# Altium footprint library Austindetz_CM4_Board_v1.0.PcbLib: 102 footprints (part 4 of 7)
Each footprint in its own frame and in the unit in brackets; x right, y up, seen from the top. Pads: shape width x height; smd on the part's side, far side on the other; paste and mask are expansions set on the pad; w line width, h text height; cw(c..) or ccw(c..) is an arc to the next point about the centre after c.
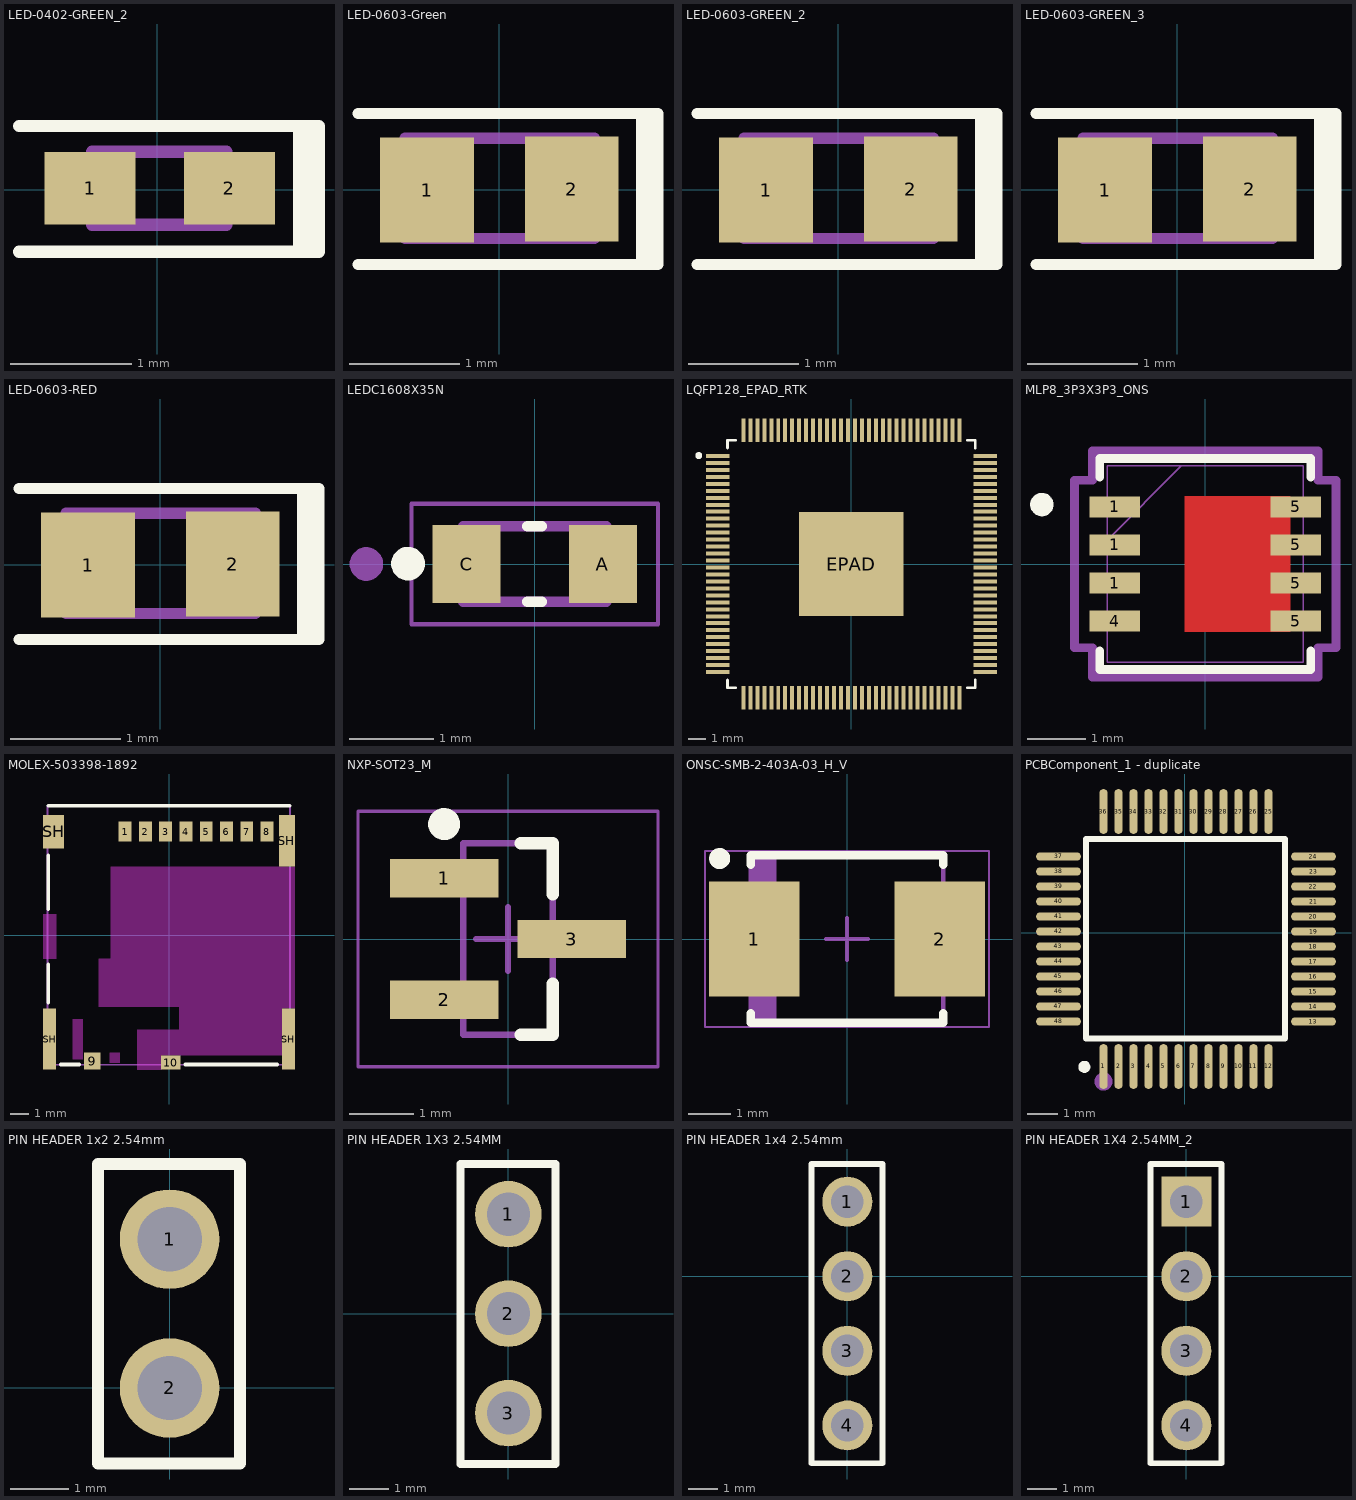
[diagram p3: the footprints below, top view; thin cyan lines are the x and y axes]

## LED-0402-GREEN_2 [mm]
pads (2):
  rect 0.75x0.6 smd: 1(-0.556,0.014) 2(0.594,0.014)
Top Overlay:
  lines w0.1: -1.142,-0.51 1.259,-0.51 1.259,0.526 ; -1.142,0.526 1.259,0.526 ; 1.169,0.516 1.169,-0.511 1.332,-0.51 1.332,0.526 1.259,0.526
Top Assembly:
  lines w0.1: -0.539,-0.287 0.568,-0.287 0.568,0.315 -0.539,0.315 -0.539,-0.287
  text "'.Designator'" at -2.951,-1.606 h1.27
3D body "ChipLedWith-Green.stp": height 0.16, standoff 0, extent -0.502,-0.252 0.502,0.252

## LED-0603-Green [mm] "Chip Resistor, 2-Leads, Body 1.60x0.80mm, IPC Medium Density"
height 0.45
pads (2):
  rect 0.85x0.95 smd: 1(-0.655,-0.005) 2(0.655,0.005)
Top Overlay:
  lines w0.1: -1.281,-0.68 1.288,-0.68 ; -1.281,0.691 1.288,0.691 ; 1.319,0.691 1.436,0.691 1.436,-0.68 1.288,-0.68 ; 1.35,-0.68 1.35,0.691 1.288,0.691 ; 1.288,-0.68 1.288,0.691
Top Assembly:
  lines w0.1: -0.856,-0.441 0.862,-0.441 0.862,0.465 -0.797,0.465 -0.856,0.465 -0.856,-0.441
  text "'.Designator'" at -2.79,-1.783 h1.27
3D body "LED Green SMD 0603 Würth 150060BS55040.stp": height 0.4, standoff 0, extent -0.8,-0.4 0.8,0.4

## LED-0603-GREEN_2 [mm]
pads (2):
  rect 0.85x0.95 smd: 1(-0.655,-0.005) 2(0.655,0.005)
Top Overlay:
  lines w0.1: -1.281,-0.68 1.288,-0.68 ; -1.281,0.691 1.288,0.691 ; 1.319,0.691 1.436,0.691 1.436,-0.68 1.288,-0.68 ; 1.35,-0.68 1.35,0.691 1.288,0.691 ; 1.288,-0.68 1.288,0.691
Top Assembly:
  lines w0.1: -0.856,-0.441 -0.856,0.465 -0.797,0.465 0.862,0.465 0.862,-0.441 -0.856,-0.441
  text "'.Designator'" at -2.79,-1.783 h1.27
3D body "LED Green SMD 0603 Würth 150060BS55040.stp": height 0.4, standoff 0, extent -0.8,-0.4 0.8,0.4

## LED-0603-GREEN_3 [mm]
pads (2):
  rect 0.85x0.95 smd: 1(-0.655,-0.005) 2(0.655,0.005)
Top Overlay:
  lines w0.1: -1.281,-0.68 1.288,-0.68 ; -1.281,0.691 1.288,0.691 ; 1.319,0.691 1.436,0.691 1.436,-0.68 1.288,-0.68 ; 1.35,-0.68 1.35,0.691 1.288,0.691 ; 1.288,-0.68 1.288,0.691
Top Assembly:
  lines w0.1: -0.856,-0.441 -0.856,0.465 -0.797,0.465 0.862,0.465 0.862,-0.441 -0.856,-0.441
  text "'.Designator'" at -2.79,-1.783 h1.27
3D body "LED Green SMD 0603 Würth 150060BS55040.stp": height 0.4, standoff 0, extent -0.8,-0.4 0.8,0.4

## LED-0603-RED [mm] "Chip Resistor, 2-Leads, Body 1.60x0.80mm, IPC Medium Density"
height 0.45
pads (2):
  rect 0.85x0.95 smd: 1(-0.655,-0.005) 2(0.655,0.005)
Top Overlay:
  lines w0.1: -1.281,-0.68 1.288,-0.68 ; -1.281,0.691 1.288,0.691 ; 1.319,0.691 1.436,0.691 1.436,-0.68 1.288,-0.68 ; 1.35,-0.68 1.35,0.691 1.288,0.691 ; 1.288,-0.68 1.288,0.691
Top Assembly:
  lines w0.1: -0.856,-0.441 0.862,-0.441 0.862,0.465 -0.797,0.465 -0.856,0.465 -0.856,-0.441
  text "'.Designator'" at -3.196,-1.747 h1.27
3D body "LED Red SMD 0603 Würth 150060SS55040.stp": height 0.4, standoff 0, extent -0.8,-0.4 0.8,0.4

## LEDC1608X35N [mm]
height 13.32
pads (2):
  rect 0.81x0.93 smd: A(0.81,0) C(-0.81,0)
Top Overlay:
  circle w0.2: c-1.505,0.004 r0.1
  lines w0.127: -0.085,-0.45 0.085,-0.45 ; -0.085,0.45 0.085,0.45
Mechanical 13:
  circle w0.2: c-2,0 r0.1
  lines w0.127: -0.85,-0.45 0.85,-0.45 0.85,0.45 -0.85,0.45 -0.85,-0.45
Mechanical 15:
  lines w0.05: -1.465,-0.715 1.465,-0.715 1.465,0.715 -1.465,0.715 -1.465,-0.715

## LQFP128_EPAD_RTK [mil]
height 130.31
pads (129):
  rect 53.5x9 smd: 1(-302.25,244.09) 2(-302.25,228.35) 3(-302.25,212.6) 4(-302.25,196.85) 5(-302.25,181.1) 6(-302.25,165.35) 7(-302.25,149.61) 8(-302.25,133.86) 9(-302.25,118.11) 10(-302.25,102.36) 11(-302.25,86.61) 12(-302.25,70.87) 13(-302.25,55.12) 14(-302.25,39.37) 15(-302.25,23.62) 16(-302.25,7.87) 17(-302.25,-7.87) 18(-302.25,-23.62) 19(-302.25,-39.37) 20(-302.25,-55.12) 21(-302.25,-70.87) 22(-302.25,-86.61) 23(-302.25,-102.36) 24(-302.25,-118.11) 25(-302.25,-133.86) 26(-302.25,-149.61) 27(-302.25,-165.35) 28(-302.25,-181.1) 29(-302.25,-196.85) 30(-302.25,-212.6) 31(-302.25,-228.35) 32(-302.25,-244.09) 65(302.25,-244.09) 66(302.25,-228.35) 67(302.25,-212.6) 68(302.25,-196.85) 69(302.25,-181.1) 70(302.25,-165.35) 71(302.25,-149.61) 72(302.25,-133.86) 73(302.25,-118.11) 74(302.25,-102.36) 75(302.25,-86.61) 76(302.25,-70.87) 77(302.25,-55.12) 78(302.25,-39.37) 79(302.25,-23.62) 80(302.25,-7.87) 81(302.25,7.87) 82(302.25,23.62) 83(302.25,39.37) 84(302.25,55.12) 85(302.25,70.87) 86(302.25,86.61) 87(302.25,102.36) 88(302.25,118.11) 89(302.25,133.86) 90(302.25,149.61) 91(302.25,165.35) 92(302.25,181.1) 93(302.25,196.85) 94(302.25,212.6) 95(302.25,228.35) 96(302.25,244.09)
  rect 9x53.5 smd: 33(-244.09,-302.25) 34(-228.35,-302.25) 35(-212.6,-302.25) 36(-196.85,-302.25) 37(-181.1,-302.25) 38(-165.35,-302.25) 39(-149.61,-302.25) 40(-133.86,-302.25) 41(-118.11,-302.25) 42(-102.36,-302.25) 43(-86.61,-302.25) 44(-70.87,-302.25) 45(-55.12,-302.25) 46(-39.37,-302.25) 47(-23.62,-302.25) 48(-7.87,-302.25) 49(7.87,-302.25) 50(23.62,-302.25) 51(39.37,-302.25) 52(55.12,-302.25) 53(70.87,-302.25) 54(86.61,-302.25) 55(102.36,-302.25) 56(118.11,-302.25) 57(133.86,-302.25) 58(149.61,-302.25) 59(165.35,-302.25) 60(181.1,-302.25) 61(196.85,-302.25) 62(212.6,-302.25) 63(228.35,-302.25) 64(244.09,-302.25) 97(244.09,302.25) 98(228.35,302.25) 99(212.6,302.25) 100(196.85,302.25) 101(181.1,302.25) 102(165.35,302.25) 103(149.61,302.25) 104(133.86,302.25) 105(118.11,302.25) 106(102.36,302.25) 107(86.61,302.25) 108(70.87,302.25) 109(55.12,302.25) 110(39.37,302.25) 111(23.62,302.25) 112(7.87,302.25) 113(-7.87,302.25) 114(-23.62,302.25) 115(-39.37,302.25) 116(-55.12,302.25) 117(-70.87,302.25) 118(-86.61,302.25) 119(-102.36,302.25) 120(-118.11,302.25) 121(-133.86,302.25) 122(-149.61,302.25) 123(-165.35,302.25) 124(-181.1,302.25) 125(-196.85,302.25) 126(-212.6,302.25) 127(-228.35,302.25) 128(-244.09,302.25)
  rect 236x236 smd paste+0: EPAD(0,0)
Top Overlay:
  circle w7.87: c-345,245 r3.94
  lines w6: -280,-262 -280,-280 -262,-280 ; -280,262 -280,280 -262,280 ; 262,-280 280,-280 280,-262 ; 262,280 280,280 280,262
Top Paste:
  region: -114.06,114.06 -114.06,62.94 -62.94,62.94 -62.94,114.06
  region: -114.06,55.06 -114.06,3.94 -62.94,3.94 -62.94,55.06
  region: -114.06,-3.94 -114.06,-55.06 -62.94,-55.06 -62.94,-3.94
  region: -114.06,-62.94 -114.06,-114.06 -62.94,-114.06 -62.94,-62.94
  region: -55.06,114.06 -55.06,62.94 -3.94,62.94 -3.94,114.06
  region: -55.06,55.06 -55.06,3.94 -3.94,3.94 -3.94,55.06
  region: -55.06,-3.94 -55.06,-55.06 -3.94,-55.06 -3.94,-3.94
  region: -55.06,-62.94 -55.06,-114.06 -3.94,-114.06 -3.94,-62.94
  region: 3.94,114.06 3.94,62.94 55.06,62.94 55.06,114.06
  region: 3.94,55.06 3.94,3.94 55.06,3.94 55.06,55.06
  region: 3.94,-3.94 3.94,-55.06 55.06,-55.06 55.06,-3.94
  region: 3.94,-62.94 3.94,-114.06 55.06,-114.06 55.06,-62.94
  region: 62.94,114.06 62.94,62.94 114.06,62.94 114.06,114.06
  region: 62.94,55.06 62.94,3.94 114.06,3.94 114.06,55.06
  region: 62.94,-3.94 62.94,-55.06 114.06,-55.06 114.06,-3.94
  region: 62.94,-62.94 62.94,-114.06 114.06,-114.06 114.06,-62.94
Mechanical 18:
  lines w6: 302,244 315,244
3D body: height 39.37, standoff 0, extent -280,-280.83 280,280

## MLP8_3P3X3P3_ONS [mil]
height 130.31
pads (8):
  rect 34x14 smd paste+0 mask+0: 1(-61,-12.8) 1(-61,12.8) 1(-61,38.39) 4(-61,-38.39) 5(61,-38.39) 5(61,-12.8) 5(61,12.8) 5(61,38.39)
Top Layer:
  region: -13.85,-45.5 -13.85,45.5 57.15,45.5 57.15,-45.5
Top Overlay:
  circle w7.87: c-110,40 r3.94
  lines w6: -71,-58.49 -71,-71 71,-71 71,-58.49 ; -71,58.49 -71,71 71,71 71,58.49
Top Paste:
  region: -13.85,-45.5 -13.85,45.5 57.15,45.5 57.15,-45.5
Top Solder:
  region: -13.85,-45.5 -13.85,45.5 57.15,45.5 57.15,-45.5
Mechanical 13:
  lines w1: -66,16 -16,66 ; -66,-66 -66,66 66,66 66,-66 -66,-66 ; -66,-46.39 -66,-30.39 -66,-46.39 ; -66,-20.8 -66,-4.8 -66,-20.8 ; -66,4.8 -66,20.8 -66,4.8 ; -66,30.39 -66,46.39 -66,30.39 ; 66,-46.39 66,-30.39 66,-46.39 ; 66,-20.8 66,-4.8 66,-20.8 ; 66,4.8 66,20.8 66,4.8 ; 66,30.39 66,46.39 66,30.39
  text "*" at -31.5,13.39 h50
Mechanical 15:
  lines w6: -88,-56.39 -88,56.39 -76,56.39 -76,76 -5.2,76 5.2,76 76,76 76,56.39 88,56.39 88,-56.39 76,-56.39 76,-76 5.2,-76 -5.2,-76 -76,-76 -76,-56.39 -88,-56.39
3D body "MLP8_3P3X3P3_ONS.step": height 32.09, standoff 0, extent -65.98,-65.98 65.98,65.98

## MOLEX-503398-1892 [mm]
pads (14):
  rect 0.7x1.1 smd: 1(-2.38,5.625) 2(-1.28,5.625) 3(-0.18,5.625) 4(0.92,5.625) 5(2.02,5.625) 6(3.12,5.625) 7(4.22,5.625) 8(5.32,5.625)
  rect 0.9x0.93 smd: 9(-4.17,-6.84)
  rect 1.05x0.78 smd: 10(0.095,-6.915)
  rect 0.7x3.33 smd: SH(-6.48,-5.64) SH(6.48,-5.64)
  rect 1.14x1.83 smd: SH(-6.26,5.61)
  rect 0.86x2.8 smd: SH(6.4,5.125)
Top Overlay:
  lines w0.2: -6.55,-3.675 -6.55,-1.575 ; -6.55,1.425 -6.55,4.325 ; -6.55,7.025 6.55,7.025 ; -5.876,-7.025 -4.874,-7.025 ; 0.874,-7.025 5.876,-7.025
Keep-Out Layer:
  region: -6.13,-1.276 -6.836,-1.276 -6.836,1.125 -6.13,1.125
  region: -2.67,-6.93 -3.223,-6.93 -3.223,-6.375 -2.67,-6.375
  region: -4.685,-6.73 -5.239,-6.73 -5.239,-4.575 -4.685,-4.575
  region: -2.67,-6.937 -3.225,-6.937 -3.225,-6.375 -2.67,-6.375
  region: 6.827,-3.975 6.127,-3.975 6.127,-6.526 -0.43,-6.526 -0.43,-7.305 -1.73,-7.305 -1.73,-5.125 0.57,-5.125 0.57,-3.875 -3.82,-3.875 -3.82,-1.275 -3.17,-1.275 -3.17,3.725 6.827,3.725
Top Assembly:
  lines w0.1: -6.599,-7.04 -6.599,7.007 6.563,7.007 6.563,-7.04 -6.599,-7.04
  text "'.Designator'" at -5.403,-0.523 h2
3D body "5033981892--3DModel-STEP-56544.STEP": height 1.4, standoff 0, extent -6.55,-7.025 6.55,7.045

## NXP-SOT23_M [mm] "SOT23, 3-Leads, Body 3x1.4mm, Pitch 0.95mm, IPC Low Density"
height 1.1
pads (3):
  rect 1.7x0.6 smd: 1(-1,0.95) 2(-1,-0.95) 3(1,0)
Top Overlay:
  circle w0.25: c-1,1.8 r0.125
  lines w0.2: 0.2,-1.5 0.7,-1.5 0.7,-0.7 ; 0.2,1.5 0.7,1.5 0.7,0.7
Mechanical 13:
  lines w0.1: -0.7,-1.5 -0.7,1.5 0.7,1.5 0.7,-1.5 -0.7,-1.5
Mechanical 15:
  lines w0.05: -2.35,-2 -2.35,2 2.35,2 2.35,-2 -2.35,-2
  lines w0.1: -0.5,0 0.5,0 ; 0,-0.5 0,0.5
3D body: height 1.1, standoff 0, extent -0.7,-1.5 0.7,1.5

## ONSC-SMB-2-403A-03_H_V [mm] "Molded, 2-Leads, Body 4.6x3.95mm"
height 2.42
pads (2):
  rect 2.159x2.743 smd: 1(-2.21,0) 2(2.21,0)
Top Overlay:
  circle w0.25: c-3.04,1.921 r0.125
  lines w0.2: -2.3,-1.772 -2.3,-2 2.3,-2 2.3,-1.772 ; -2.3,1.772 -2.3,2 2.3,2 2.3,1.772
Mechanical 13:
  rectangle: -2.3,-1.975 -1.681,1.975
  lines w0.1: -2.3,-1.975 -2.3,1.975 2.3,1.975 2.3,-1.975 -2.3,-1.975
Mechanical 15:
  lines w0.05: -3.39,-2.1 -3.39,2.1 3.39,2.1 3.39,-2.1 -3.39,-2.1
  lines w0.1: -0.5,0 0.5,0 ; 0,-0.5 0,0.5
3D body: height 2.42, standoff 0, extent -2.3,-1.975 2.3,1.975

## PCBComponent_1 - duplicate [mm]
pads (48):
  oval 0.27x1.5 smd paste+0 mask+0.05: 1(-2.703,-4.457) 2(-2.203,-4.457) 3(-1.703,-4.457) 4(-1.203,-4.457) 5(-0.703,-4.457) 6(-0.203,-4.457) 7(0.297,-4.457) 8(0.797,-4.457) 9(1.297,-4.457) 10(1.797,-4.457) 11(2.297,-4.457) 12(2.797,-4.457) 25(2.797,4.043) 26(2.297,4.043) 27(1.797,4.043) 28(1.297,4.043) 29(0.797,4.043) 30(0.297,4.043) 31(-0.203,4.043) 32(-0.703,4.043) 33(-1.203,4.043) 34(-1.703,4.043) 35(-2.203,4.043) 36(-2.703,4.043)
  oval 1.5x0.27 smd paste+0 mask+0.05: 13(4.297,-2.957) 14(4.297,-2.457) 15(4.297,-1.957) 16(4.297,-1.457) 17(4.297,-0.957) 18(4.297,-0.457) 19(4.297,0.043) 20(4.297,0.543) 21(4.297,1.043) 22(4.297,1.543) 23(4.297,2.043) 24(4.297,2.543) 37(-4.203,2.543) 38(-4.203,2.043) 39(-4.203,1.543) 40(-4.203,1.043) 41(-4.203,0.543) 42(-4.203,0.043) 43(-4.203,-0.457) 44(-4.203,-0.957) 45(-4.203,-1.457) 46(-4.203,-1.957) 47(-4.203,-2.457) 48(-4.203,-2.957)
Top Overlay:
  lines w0.2: -3.342,-4.367 ccw(c-3.342,-4.467) -3.341,-4.367 ; -2.849,3.133 3.349,3.133 3.349,-3.522 -3.28,-3.522 -3.28,3.133 -2.518,3.133
Mechanical 15:
  circle w0.3: c-2.703,-4.957 r0.15
3D body: height 0.8, standoff 0, extent -3.28,-3.521 3.348,3.132

## PIN HEADER 1x2 2.54mm [mm]
pads (2):
  round 1.7 hole 1.1: 1(0,2.54) 2(0,0)
Top Overlay:
  lines w0.2: -1.221,-1.289 -1.221,3.823 1.2,3.823 1.2,-1.289 -1.221,-1.289
Top Assembly:
  lines w0.1: -1.207,-1.297 -1.207,3.817 1.158,3.817 1.158,-1.297 -1.207,-1.297
  text "'.Designator'" at -3.212,-2.878 h1.27

## PIN HEADER 1X3 2.54MM [mm]
pads (3):
  round 1.7 hole 1.1: 1(0,2.54) 2(0,0) 3(0,-2.54)
Top Overlay:
  lines w0.2: -1.221,-3.838 -1.221,3.823 1.2,3.823 1.2,-3.838 -1.221,-3.838
Top Assembly:
  lines w0.1: -1.207,-3.838 -1.207,3.817 1.158,3.817 1.158,-3.838 -1.207,-3.838
  text "'.Designator'" at -0.592,0.849 h2
3D body "1x3 TH Vert 100mil.STEP": height 8.38, standoff -3.3, extent -1.276,-3.819 1.264,3.801

## PIN HEADER 1x4 2.54mm [mm]
height 3.31
pads (4):
  round 1.7 hole 1.1: 1(0,2.54) 2(0,0) 3(0,-2.54) 4(0,-5.08)
Top Overlay:
  lines w0.2: -1.221,-6.368 -1.221,3.823 1.2,3.823 1.2,-6.368 -1.221,-6.368
Top Assembly:
  lines w0.1: -1.207,-6.396 -1.207,3.817 1.158,3.817 1.158,-6.396 -1.207,-6.396
  text "'.Designator'" at -2.54,-7.62 h1.27

## PIN HEADER 1X4 2.54MM_2 [mm]
pads (4):
  rect 1.7x1.7 hole 1.1: 1(0,2.54)
  round 1.7 hole 1.1: 2(0,0) 3(0,-2.54) 4(0,-5.08)
Top Overlay:
  lines w0.2: -1.221,-6.368 1.2,-6.368 1.2,3.823 -1.221,3.823 -1.221,-6.368
Top Assembly:
  lines w0.1: -1.207,-6.396 1.158,-6.396 1.158,3.817 -1.207,3.817 -1.207,-6.396
  text "'.Designator'" at -2.54,-7.62 h1.27
3D body "61300411121.stp": height 8.55, standoff -2.99, extent -1.27,-6.35 1.27,3.81